# Altium footprint library Mylib.PcbLib: 294 footprints (part 6 of 19) (continued)
## JMU100 [mm] (continued)
; 11.302,-1.075 15.879,-1.075 ; 11.345,-2.629 11.647,-2.629 ; 11.431,-1.032 15.793,-1.032 ; 11.475,-2.673 11.604,-2.673 ; 11.518,-0.988 15.706,-0.988 ; 11.561,-0.945 15.577,-0.945 ; 11.691,-0.902 15.534,-0.902 ; 11.82,-2.629 11.95,-2.629 ; 11.82,-0.859 15.447,-0.859 ; 11.95,-0.816 15.361,-0.816 ; 12.079,-0.773 15.231,-0.773 ; 12.122,-0.729 15.145,-0.729 ; 12.209,-0.686 14.972,-0.686 ; 12.252,-0.643 14.886,-0.643 ; 12.554,-2.284 17.261,-2.284 ; 12.554,-0.6 14.756,-0.6 ; 12.597,-2.413 12.727,-2.413 ; 12.597,-2.37 17.304,-2.37 ; 12.597,-2.327 17.304,-2.327 ; 12.64,-2.457 12.684,-2.457 ; 12.856,-0.557 14.54,-0.557 ; 12.9,-0.514 14.454,-0.514 ; 12.9,-0.47 14.238,-0.47 ; 12.943,-0.427 13.85,-0.427 ; 12.943,-0.384 13.634,-0.384 ; 13.029,-9.538 13.245,-9.538 ; 13.029,-9.495 13.331,-9.495 ; 13.029,-9.452 13.85,-9.452 ; 13.029,-0.341 13.288,-0.341 ; 13.072,-2.413 17.347,-2.413 ; 13.159,-2.457 17.39,-2.457 ; 13.245,-9.409 13.979,-9.409 ; 13.418,-9.365 14.152,-9.365 ; 13.461,-9.495 13.547,-9.495 ; 13.763,-9.322 14.454,-9.322 ; 13.85,-9.279 14.54,-9.279 ; 13.936,-2.5 17.39,-2.5 ; 13.979,-9.236 14.584,-9.236 ; 14.065,-2.543 17.433,-2.543 ; 14.109,-2.586 17.477,-2.586 ; 14.195,-9.193 14.756,-9.193 ; 14.195,-2.629 17.52,-2.629 ; 14.281,-9.365 14.411,-9.365 ; 14.281,-9.15 14.843,-9.15 ; 14.281,-2.716 17.563,-2.716 ; 14.281,-2.673 17.563,-2.673 ; 14.324,-2.802 14.886,-2.802 ; 14.324,-2.759 17.563,-2.759 ; 14.368,-9.106 14.972,-9.106 ; 14.411,-2.845 14.843,-2.845 ; 14.497,-9.063 15.102,-9.063 ; 14.584,-9.02 15.188,-9.02 ; 14.67,-8.977 15.318,-8.977 ; 14.67,-2.888 14.799,-2.888 ; 14.843,-8.934 15.447,-8.934 ; 14.886,-8.89 15.534,-8.89 ; 14.972,-8.847 15.62,-8.847 ; 15.059,-8.804 15.706,-8.804 ; 15.059,-2.802 17.606,-2.802 ; 15.102,-2.845 17.649,-2.845 ; 15.145,-8.761 15.749,-8.761 ; 15.145,-2.888 17.693,-2.888 ; 15.231,-8.718 15.793,-8.718 ; 15.318,-8.675 15.922,-8.675 ; 15.318,-2.975 17.736,-2.975 ; 15.318,-2.932 17.693,-2.932 ; 15.361,-8.631 15.965,-8.631 ; 15.404,-3.018 17.736,-3.018 ; 15.447,-8.588 16.052,-8.588 ; 15.447,-3.104 17.779,-3.104 ; 15.447,-3.061 17.779,-3.061 ; 15.49,-3.147 17.822,-3.147 ; 15.534,-8.545 16.138,-8.545 ; 15.534,-3.191 17.822,-3.191 ; 15.577,-3.234 17.865,-3.234 ; 15.62,-8.502 16.181,-8.502 ; 15.62,-3.277 17.865,-3.277 ; 15.706,-8.459 16.268,-8.459 ; 15.706,-3.32 17.908,-3.32 ; 15.749,-8.415 16.311,-8.415 ; 15.749,-3.363 17.952,-3.363 ; 15.793,-8.372 16.397,-8.372 ; 15.793,-3.407 17.952,-3.407 ; 15.836,-3.45 17.995,-3.45 ; 15.879,-8.329 16.483,-8.329 ; 15.922,-8.286 16.527,-8.286 ; 15.922,-3.493 17.995,-3.493 ; 15.965,-3.536 16.527,-3.536 ; 16.009,-8.243 16.57,-8.243 ; 16.009,-3.579 16.527,-3.579 ; 16.052,-8.2 16.613,-8.2 ; 16.052,-3.622 16.527,-3.622 ; 16.095,-8.156 16.656,-8.156 ; 16.095,-3.752 16.57,-3.752 ; 16.095,-3.709 16.57,-3.709 ; 16.095,-3.666 16.527,-3.666 ; 16.138,-8.113 16.699,-8.113 ; 16.138,-3.795 16.613,-3.795 ; 16.181,-3.838 16.613,-3.838 ; 16.224,-3.925 16.656,-3.925 ; 16.224,-3.882 16.656,-3.882 ; 16.268,-8.07 16.743,-8.07 ; 16.268,-4.011 16.699,-4.011 ; 16.268,-3.968 16.699,-3.968 ; 16.311,-8.027 16.829,-8.027 ; 16.311,-4.054 16.699,-4.054 ; 16.354,-7.984 16.829,-7.984 ; 16.354,-4.141 16.743,-4.141 ; 16.354,-4.097 16.743,-4.097 ; 16.397,-7.94 16.829,-7.94 ; 16.397,-4.227 16.786,-4.227 ; 16.397,-4.184 16.786,-4.184 ; 16.44,-7.897 16.915,-7.897 ; 16.44,-4.313 16.829,-4.313 ; 16.44,-4.27 16.829,-4.27 ; 16.483,-7.854 16.958,-7.854 ; 16.483,-4.4 16.872,-4.4 ; 16.483,-4.357 16.872,-4.357 ; 16.527,-7.811 17.045,-7.811 ; 16.527,-4.529 16.915,-4.529 ; 16.527,-4.486 16.915,-4.486 ; 16.527,-4.443 16.872,-4.443 ; 16.57,-7.768 17.045,-7.768 ; 16.57,-4.572 16.915,-4.572 ; 16.613,-7.725 17.088,-7.725 ; 16.613,-4.745 17.002,-4.745 ; 16.613,-4.702 16.958,-4.702 ; 16.613,-4.659 16.958,-4.659 ; 16.613,-4.616 16.958,-4.616 ; 16.656,-7.681 17.433,-7.681 ; 16.656,-4.832 17.002,-4.832 ; 16.656,-4.788 17.002,-4.788 ; 16.656,-3.536 17.995,-3.536 ; 16.699,-7.638 17.477,-7.638 ; 16.699,-5.047 17.045,-5.047 ; 16.699,-5.004 17.045,-5.004 ; 16.699,-4.961 17.045,-4.961 ; 16.699,-4.918 17.045,-4.918 ; 16.699,-4.875 17.045,-4.875 ; 16.699,-3.579 17.995,-3.579 ; 16.743,-7.595 17.477,-7.595 ; 16.743,-5.134 17.045,-5.134 ; 16.743,-5.091 17.045,-5.091 ; 16.743,-3.666 18.038,-3.666 ; 16.743,-3.622 18.038,-3.622 ; 16.786,-7.552 17.52,-7.552 ; 16.786,-7.509 17.563,-7.509 ; 16.786,-5.177 17.045,-5.177 ; 16.786,-3.709 18.038,-3.709 ; 16.829,-7.465 17.606,-7.465 ; 16.829,-6.3 16.958,-6.3 ; 16.829,-6.256 16.958,-6.256 ; 16.829,-5.306 17.045,-5.306 ; 16.829,-5.263 17.045,-5.263 ; 16.829,-5.22 17.045,-5.22 ; 16.829,-3.752 18.081,-3.752 ; 16.872,-7.422 17.649,-7.422 ; 16.872,-6.213 16.958,-6.213 ; 16.872,-6.17 16.958,-6.17 ; 16.872,-6.127 17.002,-6.127 ; 16.872,-6.084 17.002,-6.084 ; 16.872,-6.041 17.002,-6.041 ; 16.872,-5.997 17.002,-5.997 ; 16.872,-5.954 17.002,-5.954 ; 16.872,-5.911 17.045,-5.911 ; 16.872,-5.868 17.045,-5.868 ; 16.872,-5.825 17.045,-5.825 ; 16.872,-5.781 17.045,-5.781 ; 16.872,-5.738 17.045,-5.738 ; 16.872,-5.695 17.045,-5.695 ; 16.872,-5.652 17.045,-5.652 ; 16.872,-5.609 17.045,-5.609 ; 16.872,-5.566 17.045,-5.566 ; 16.872,-5.522 17.045,-5.522 ; 16.872,-5.479 17.045,-5.479 ; 16.872,-5.436 17.045,-5.436 ; 16.872,-5.393 17.045,-5.393 ; 16.872,-5.35 17.045,-5.35 ; 16.872,-3.795 18.124,-3.795 ; 16.915,-8.2 17.088,-8.2 ; 16.915,-8.156 17.088,-8.156 ; 16.915,-8.113 17.131,-8.113 ; 16.915,-7.379 17.649,-7.379 ; 16.915,-4.011 18.124,-4.011 ; 16.915,-3.882 18.124,-3.882 ; 16.915,-3.838 18.124,-3.838 ; 16.958,-8.243 17.045,-8.243 ; 16.958,-8.07 17.174,-8.07 ; 16.958,-7.336 17.693,-7.336 ; 16.958,-7.293 17.736,-7.293 ; 16.958,-4.054 18.124,-4.054 ; 16.958,-3.968 18.124,-3.968 ; 16.958,-3.925 18.124,-3.925 ; 17.002,-8.027 17.218,-8.027 ; 17.002,-7.25 17.736,-7.25 ; 17.002,-4.141 18.168,-4.141 ; 17.002,-4.097 18.168,-4.097 ; 17.045,-7.984 17.261,-7.984 ; 17.045,-7.94 17.261,-7.94 ; 17.045,-7.206 17.779,-7.206 ; 17.045,-7.163 17.779,-7.163 ; 17.088,-7.897 17.261,-7.897 ; 17.088,-7.12 17.779,-7.12 ; 17.088,-7.077 17.779,-7.077 ; 17.088,-4.227 18.168,-4.227 ; 17.088,-4.184 18.168,-4.184 ; 17.131,-7.034 17.822,-7.034 ; 17.131,-4.313 18.168,-4.313 ; 17.131,-4.27 18.168,-4.27 ; 17.174,-7.854 17.304,-7.854 ; 17.174,-6.991 17.865,-6.991 ; 17.174,-6.947 17.865,-6.947 ; 17.174,-6.904 17.865,-6.904 ; 17.174,-4.4 18.211,-4.4 ; 17.174,-4.357 18.211,-4.357 ; 17.218,-7.811 17.347,-7.811 ; 17.218,-7.768 17.347,-7.768 ; 17.218,-7.725 17.39,-7.725 ; 17.218,-6.861 17.908,-6.861 ; 17.218,-6.818 17.908,-6.818 ; 17.218,-4.443 18.211,-4.443 ; 17.261,-6.775 17.952,-6.775 ; 17.261,-6.731 17.952,-6.731 ; 17.261,-5.177 18.211,-5.177 ; 17.261,-5.134 18.211,-5.134 ; 17.261,-5.091 18.211,-5.091 ; 17.261,-5.047 18.254,-5.047 ; 17.261,-4.529 18.254,-4.529 ; 17.261,-4.486 18.254,-4.486 ; 17.304,-6.688 17.995,-6.688 ; 17.304,-6.645 17.995,-6.645 ; 17.304,-6.602 18.038,-6.602 ; 17.304,-6.559 18.038,-6.559 ; 17.304,-5.004 18.254,-5.004 ; 17.304,-4.659 18.254,-4.659 ; 17.304,-4.616 18.254,-4.616 ; 17.304,-4.572 18.254,-4.572 ; 17.347,-6.516 18.038,-6.516 ; 17.347,-6.472 18.038,-6.472 ; 17.347,-6.429 18.038,-6.429 ; 17.347,-5.22 18.211,-5.22 ; 17.347,-4.832 18.297,-4.832 ; 17.347,-4.788 18.297,-4.788 ; 17.347,-4.745 18.254,-4.745 ; 17.347,-4.702 18.254,-4.702 ; 17.39,-6.386 18.038,-6.386 ; 17.39,-6.343 18.081,-6.343 ; 17.39,-6.3 18.081,-6.3 ; 17.39,-6.256 18.081,-6.256 ; 17.39,-4.961 18.297,-4.961 ; 17.39,-4.918 18.297,-4.918 ; 17.39,-4.875 18.297,-4.875 ; 17.433,-6.213 18.081,-6.213 ; 17.433,-6.17 18.124,-6.17 ; 17.433,-6.127 18.124,-6.127 ; 17.433,-6.084 18.124,-6.084 ; 17.433,-6.041 18.124,-6.041 ; 17.433,-5.997 18.124,-5.997 ; 17.477,-5.954 18.168,-5.954 ; 17.477,-5.911 18.168,-5.911 ; 17.477,-5.868 18.168,-5.868 ; 17.477,-5.825 18.168,-5.825 ; 17.477,-5.781 18.168,-5.781 ; 17.477,-5.738 18.168,-5.738 ; 17.477,-5.695 18.168,-5.695 ; 17.477,-5.652 18.168,-5.652 ; 17.477,-5.609 18.168,-5.609 ; 17.477,-5.566 18.168,-5.566 ; 17.477,-5.522 18.168,-5.522 ; 17.477,-5.479 18.168,-5.479 ; 17.477,-5.436 18.168,-5.436 ; 17.477,-5.393 18.211,-5.393 ; 17.477,-5.35 18.211,-5.35 ; 17.477,-5.306 18.211,-5.306 ; 17.477,-5.263 18.211,-5.263
  text "1918-2018" at 6.825,-7.9 h1.78
Bottom Solder:
  drawing of 979 lines, arcs and shapes, not listed
  text "1918-2018" at 6.825,-7.9 h1.78

## JMU_LOGO(1.35cm) [mm]
Bottom Overlay:
  drawing of 2455 lines, arcs and shapes, not listed
  text "1918" at -0.759,-2.891 h1.27

## K60(龙邱底板) [mil]
pads (124):
  oval 59x66 hole 32: 1(-640,-575.68) 2(-640,-475.68) 3(-540,-575.68) 4(-540,-475.68) 5(-440,-575.68) 6(-440,-475.68) 7(-340,-575.68) 8(-340,-475.68) 9(-240,-575.68) 10(-240,-475.68) 11(-140,-575.68) 12(-139.21,-475.68) 13(-40,-575.68) 14(-40,-475.68) 15(60,-575.68) 16(60,-475.68) 17(160,-575.68) 18(156.85,-475.68) 19(260,-575.68) 20(262.36,-475.68) 21(360,-575.68) 22(358.82,-475.68) 23(460,-575.68) 24(457.64,-475.68) 25(560,-575.68) 26(560.39,-475.68) 27(660,-575.68) 28(660,-475.68) 29(760,-575.68) 30(760.39,-475.68) 63(760,924.32) 64(760,824.32) 65(660,924.32) 66(660,824.32) 67(560,926.29) 68(560,824.32) 69(460,924.32) 70(460,824.32) 71(360,924.32) 72(360,824.32) 73(260,924.32) 74(260,824.32) 75(160,924.32) 76(160,824.32) 77(60,924.32) 78(60,824.32) 79(-40,924.32) 80(-40,824.32) 81(-140,924.32) 82(-140,824.32) 83(-240,924.32) 84(-240,824.32) 85(-340,924.32) 86(-340,824.32) 87(-445.12,926.68) 88(-440,824.32) 89(-540,924.32) 90(-540,824.32) 91(-640,924.32) 92(-640,824.32)
  oval 66x59 hole 32: 31(860,-575.68) 32(960,-575.68) 33(860,-475.68) 34(960,-475.68) 35(860,-375.68) 36(960,-375.68) 37(860,-275.68) 38(960,-275.68) 39(860,-174.89) 40(960,-175.68) 41(860,-75.68) 42(960,-75.29) 43(860,24.32) 44(960,24.32) 45(860,124.32) 46(960,124.32) 47(860,224.32) 48(960,224.32) 49(860,324.32) 50(960,324.32) 51(860,424.32) 52(960,424.32) 53(860,524.32) 54(960,524.32) 55(860,624.32) 56(960,624.32) 57(860,724.32) 58(960,724.32) 59(860,824.32) 60(960,824.32) 61(860,924.32) 62(960,924.32) 93(-740,924.32) 94(-840,924.32) 95(-740,824.32) 96(-840,824.32) 97(-740,724.32) 98(-840,718.41) 99(-740,624.32) 100(-840,624.32) 101(-740,524.32) 102(-840,524.32) 103(-740,424.32) 104(-840,424.32) 105(-740,323.92) 106(-840,324.71) 107(-740,224.32) 108(-840,224.32) 109(-740,124.32) 110(-840,124.32) 111(-740,24.32) 112(-840,24.32) 113(-740,-75.68) 114(-840,-75.68) 115(-740,-175.68) 116(-840,-175.68) 117(-740,-275.68) 118(-840,-275.68) 119(-740,-375.68) 120(-840,-375.68) 121(-740,-475.68) 122(-840,-475.68) 123(-740,-575.68) 124(-840,-575.68)
Top Overlay:
  lines w5.91: 800,-155.68 780,-155.68 780,4.32 800,4.32 ; 1020,-335.68 800,-335.68 800,184.32 1020,184.32
  lines w7.87: -641.18,-634.74 -614.02,-662.3 -668.35,-662.3 -640.79,-634.74 ; -900,-635.68 1020,-635.68 1020,984.32 -900,984.32 -900,-635.68

## KF2EDGK5.0-3P [mm]
pads (3):
  rect 2.5x2.5 hole 1.6: 1(0,-0.025)
  round 2.5 hole 1.6: 2(5,-0.025) 3(10,-0.025)
Top Overlay:
  lines w0.254: -2.62,-2.565 -1.985,-2.565 ccw(c-0.08,-1.93) 1.825,-2.565 3.015,-2.565 ccw(c4.92,-1.93) 6.825,-2.565 8.015,-2.565 ccw(c9.92,-1.93) 11.825,-2.565 12.667,-2.565 ; -2.62,3.277 12.7,3.277 ; -2.62,3.531 12.7,3.531 ; -2.62,-4.851 12.7,-4.851 12.7,3.785 -2.62,3.785 -2.62,-4.851
3D body "KF2EDGK5.0-LI.STEP": height 11.25, standoff -2.95, extent 7.46,-4.783 12.54,3.717
3D body "KF2EDGK5.0-LI.STEP": height 11.25, standoff -2.95, extent -2.54,-4.783 2.54,3.717
3D body "KF2EDGK5.0-LI.STEP": height 11.25, standoff -2.95, extent 2.46,-4.783 7.54,3.717